# Altium integrated library Weidmueller_OMNIMATE_Signal.IntLib: 2550 symbols (part 8 of 45) (continued)
## 1250370000_Single (continued)

## 1250380000
designator E?
OMNIMATE Signal - series LSF; PartNumber: 1250380000; Manufacturer: Weidmueller; Short_text_for_material: LSF-SMD 3.50/04/180 SN BK RL; Side_termination_characteristic: closed side; Mounting_onto_the_PCB: Reflow solder connection; Pitch_mm: 3,5 mm; Pitch_inch: 0,138 inch; No_of_poles: 4; Contact_material: Cu-Leg; Contact_surface: tinned; Insulating_material: LCP GF; UL_94_flammability_rating: V-0; Rated_voltage_for_surge_voltage_class_pollution_degree_II_2: 320 V; Solid_min_H05_07_V_U: 0,2 mm²; Solid_max_H05_07_V_U: 1,5 mm²; Rated_voltage_use_group_B_UL_1059: 300 V; Rated_current_use_group_B_UL_1059: 12 A; Wire_cross_section_AWG_min_UL_1059: AWG 24; Wire_cross_section_AWG_max_UL_1059: AWG 16; PackageReference: LSF_SMD_3_5_180_04; Colour: Black; Packaging: Tape; Qty: 180 PCS; Revision: V1; ComponentLink1Description: Manufacturer URL; ComponentLink1URL: http://www.weidmueller.com/; ComponentLink2Description: URL Link1; ComponentLink2URL: http://catalog.weidmueller.com/catalog/Start.do?localeId=en&ObjectID=1250380000
footprint LSF_SMD_3_5_180_04 (OMNIMATE Signal - Serie LSF  LSF-SMD 3.50/04/180)
pins: A1, A2, A3, A4
1 alternate drawing of the same symbol

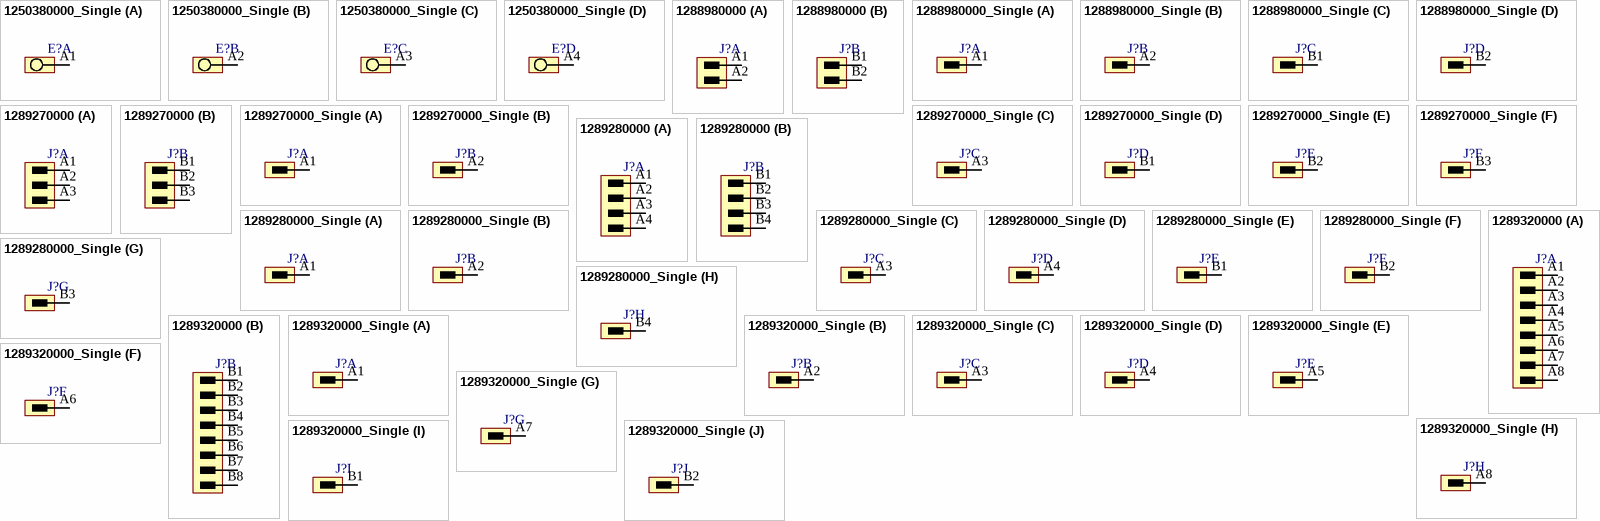
[diagram p46: symbols 1250380000_Single to 1289320000_Single]

## 1250380000_Single
designator E?
OMNIMATE Signal - series LSF; PartNumber: 1250380000; Manufacturer: Weidmueller; Short_text_for_material: LSF-SMD 3.50/04/180 SN BK RL; Side_termination_characteristic: closed side; Mounting_onto_the_PCB: Reflow solder connection; Pitch_mm: 3,5 mm; Pitch_inch: 0,138 inch; No_of_poles: 4; Contact_material: Cu-Leg; Contact_surface: tinned; Insulating_material: LCP GF; UL_94_flammability_rating: V-0; Rated_voltage_for_surge_voltage_class_pollution_degree_II_2: 320 V; Solid_min_H05_07_V_U: 0,2 mm²; Solid_max_H05_07_V_U: 1,5 mm²; Rated_voltage_use_group_B_UL_1059: 300 V; Rated_current_use_group_B_UL_1059: 12 A; Wire_cross_section_AWG_min_UL_1059: AWG 24; Wire_cross_section_AWG_max_UL_1059: AWG 16; PackageReference: LSF_SMD_3_5_180_04; Colour: Black; Packaging: Tape; Qty: 180 PCS; Revision: V1; ComponentLink1Description: Manufacturer URL; ComponentLink1URL: http://www.weidmueller.com/; ComponentLink2Description: URL Link1; ComponentLink2URL: http://catalog.weidmueller.com/catalog/Start.do?localeId=en&ObjectID=1250380000
footprint LSF_SMD_3_5_180_04 (OMNIMATE Signal - Serie LSF  LSF-SMD 3.50/04/180)
part A pins: A1
part B pins: A2
part C pins: A3
part D pins: A4
1 alternate drawing of the same symbol

## 1288980000
designator J?
OMNIMATE Signal - series B2C/S2C 3.50 - 2-row; PartNumber: 1288980000; Manufacturer: Weidmueller; Short_text_for_material: S2C-SMT 3.50/04/90G 3.2SN BK BX; Side_termination_characteristic: closed side; Mounting_onto_the_PCB: Reflow solder connection; Pitch_mm: 3.5 mm; Pitch_inch: 0.138 inch; No_of_poles: 4; Outgoing_elbow: 90°; Solder_pin_length_mm: 3.2 mm; Contact_surface: tinned; Insulating_material: LCP GF; UL_94_flammability_rating: V-0; Rated_voltage_for_surge_voltage_class_pollution_degree_II_2: 200 V; Rated_current_min_no_of_poles_TU_20_deg_C: 13.4 A; Rated_voltage_use_group_B_UL_1059: 150 V; Rated_current_use_group_B_UL_1059: 10 A; PackageReference: S2C_SMT_3_50_90G_04; Colour: Black; Packaging: Box; Qty: 222 PCS; Revision: V1; ComponentLink1Description: Manufacturer URL; ComponentLink1URL: http://www.weidmueller.com/; ComponentLink2Description: URL Link1; ComponentLink2URL: http://catalog.weidmueller.com/catalog/Start.do?localeId=en&ObjectID=1288980000
footprint S2C_SMT_3_50_90G_04 (OMNIMATE Signal - Serie B2C/S2C 3.50 - 2-reihig  S2C-SMT 3.50/04/90G 1.5S)
part A pins: A1, A2
part B pins: B1, B2

## 1288980000_Single
designator J?
OMNIMATE Signal - series B2C/S2C 3.50 - 2-row; PartNumber: 1288980000; Manufacturer: Weidmueller; Short_text_for_material: S2C-SMT 3.50/04/90G 3.2SN BK BX; Side_termination_characteristic: closed side; Mounting_onto_the_PCB: Reflow solder connection; Pitch_mm: 3.5 mm; Pitch_inch: 0.138 inch; No_of_poles: 4; Outgoing_elbow: 90°; Solder_pin_length_mm: 3.2 mm; Contact_surface: tinned; Insulating_material: LCP GF; UL_94_flammability_rating: V-0; Rated_voltage_for_surge_voltage_class_pollution_degree_II_2: 200 V; Rated_current_min_no_of_poles_TU_20_deg_C: 13.4 A; Rated_voltage_use_group_B_UL_1059: 150 V; Rated_current_use_group_B_UL_1059: 10 A; PackageReference: S2C_SMT_3_50_90G_04; Colour: Black; Packaging: Box; Qty: 222 PCS; Revision: V1; ComponentLink1Description: Manufacturer URL; ComponentLink1URL: http://www.weidmueller.com/; ComponentLink2Description: URL Link1; ComponentLink2URL: http://catalog.weidmueller.com/catalog/Start.do?localeId=en&ObjectID=1288980000
footprint S2C_SMT_3_50_90G_04 (OMNIMATE Signal - Serie B2C/S2C 3.50 - 2-reihig  S2C-SMT 3.50/04/90G 1.5S)
part A pins: A1
part B pins: A2
part C pins: B1
part D pins: B2

## 1289270000
designator J?
OMNIMATE Signal - series B2C/S2C 3.50 - 2-row; PartNumber: 1289270000; Manufacturer: Weidmueller; Short_text_for_material: S2C-SMT 3.50/06/90G 3.2SN BK BX; Side_termination_characteristic: closed side; Mounting_onto_the_PCB: Reflow solder connection; Pitch_mm: 3.5 mm; Pitch_inch: 0.138 inch; No_of_poles: 6; Outgoing_elbow: 90°; Solder_pin_length_mm: 3.2 mm; Contact_surface: tinned; Insulating_material: LCP GF; UL_94_flammability_rating: V-0; Rated_voltage_for_surge_voltage_class_pollution_degree_II_2: 200 V; Rated_current_min_no_of_poles_TU_20_deg_C: 13.4 A; Rated_voltage_use_group_B_UL_1059: 150 V; Rated_current_use_group_B_UL_1059: 10 A; PackageReference: S2C_SMT_3_50_90G_06; Colour: Black; Packaging: Box; Qty: 156 PCS; Revision: V1; ComponentLink1Description: Manufacturer URL; ComponentLink1URL: http://www.weidmueller.com/; ComponentLink2Description: URL Link1; ComponentLink2URL: http://catalog.weidmueller.com/catalog/Start.do?localeId=en&ObjectID=1289270000
footprint S2C_SMT_3_50_90G_06 (OMNIMATE Signal - Serie B2C/S2C 3.50 - 2-reihig  S2C-SMT 3.50/06/90G 1.5S)
part A pins: A1, A2, A3
part B pins: B1, B2, B3

## 1289270000_Single
designator J?
OMNIMATE Signal - series B2C/S2C 3.50 - 2-row; PartNumber: 1289270000; Manufacturer: Weidmueller; Short_text_for_material: S2C-SMT 3.50/06/90G 3.2SN BK BX; Side_termination_characteristic: closed side; Mounting_onto_the_PCB: Reflow solder connection; Pitch_mm: 3.5 mm; Pitch_inch: 0.138 inch; No_of_poles: 6; Outgoing_elbow: 90°; Solder_pin_length_mm: 3.2 mm; Contact_surface: tinned; Insulating_material: LCP GF; UL_94_flammability_rating: V-0; Rated_voltage_for_surge_voltage_class_pollution_degree_II_2: 200 V; Rated_current_min_no_of_poles_TU_20_deg_C: 13.4 A; Rated_voltage_use_group_B_UL_1059: 150 V; Rated_current_use_group_B_UL_1059: 10 A; PackageReference: S2C_SMT_3_50_90G_06; Colour: Black; Packaging: Box; Qty: 156 PCS; Revision: V1; ComponentLink1Description: Manufacturer URL; ComponentLink1URL: http://www.weidmueller.com/; ComponentLink2Description: URL Link1; ComponentLink2URL: http://catalog.weidmueller.com/catalog/Start.do?localeId=en&ObjectID=1289270000
footprint S2C_SMT_3_50_90G_06 (OMNIMATE Signal - Serie B2C/S2C 3.50 - 2-reihig  S2C-SMT 3.50/06/90G 1.5S)
part A pins: A1
part B pins: A2
part C pins: A3
part D pins: B1
part E pins: B2
part F pins: B3

## 1289280000
designator J?
OMNIMATE Signal - series B2C/S2C 3.50 - 2-row; PartNumber: 1289280000; Manufacturer: Weidmueller; Short_text_for_material: S2C-SMT 3.50/08/90G 3.2SN BK BX; Side_termination_characteristic: closed side; Mounting_onto_the_PCB: Reflow solder connection; Pitch_mm: 3.5 mm; Pitch_inch: 0.138 inch; No_of_poles: 8; Outgoing_elbow: 90°; Solder_pin_length_mm: 3.2 mm; Contact_surface: tinned; Insulating_material: LCP GF; UL_94_flammability_rating: V-0; Rated_voltage_for_surge_voltage_class_pollution_degree_II_2: 200 V; Rated_current_min_no_of_poles_TU_20_deg_C: 13.4 A; Rated_voltage_use_group_B_UL_1059: 150 V; Rated_current_use_group_B_UL_1059: 10 A; PackageReference: S2C_SMT_3_50_90G_08; Colour: Black; Packaging: Box; Qty: 120 PCS; Revision: V1; ComponentLink1Description: Manufacturer URL; ComponentLink1URL: http://www.weidmueller.com/; ComponentLink2Description: URL Link1; ComponentLink2URL: http://catalog.weidmueller.com/catalog/Start.do?localeId=en&ObjectID=1289280000
footprint S2C_SMT_3_50_90G_08 (OMNIMATE Signal - Serie B2C/S2C 3.50 - 2-reihig  S2C-SMT 3.50/08/90G 1.5S)
part A pins: A1, A2, A3, A4
part B pins: B1, B2, B3, B4

## 1289280000_Single
designator J?
OMNIMATE Signal - series B2C/S2C 3.50 - 2-row; PartNumber: 1289280000; Manufacturer: Weidmueller; Short_text_for_material: S2C-SMT 3.50/08/90G 3.2SN BK BX; Side_termination_characteristic: closed side; Mounting_onto_the_PCB: Reflow solder connection; Pitch_mm: 3.5 mm; Pitch_inch: 0.138 inch; No_of_poles: 8; Outgoing_elbow: 90°; Solder_pin_length_mm: 3.2 mm; Contact_surface: tinned; Insulating_material: LCP GF; UL_94_flammability_rating: V-0; Rated_voltage_for_surge_voltage_class_pollution_degree_II_2: 200 V; Rated_current_min_no_of_poles_TU_20_deg_C: 13.4 A; Rated_voltage_use_group_B_UL_1059: 150 V; Rated_current_use_group_B_UL_1059: 10 A; PackageReference: S2C_SMT_3_50_90G_08; Colour: Black; Packaging: Box; Qty: 120 PCS; Revision: V1; ComponentLink1Description: Manufacturer URL; ComponentLink1URL: http://www.weidmueller.com/; ComponentLink2Description: URL Link1; ComponentLink2URL: http://catalog.weidmueller.com/catalog/Start.do?localeId=en&ObjectID=1289280000
footprint S2C_SMT_3_50_90G_08 (OMNIMATE Signal - Serie B2C/S2C 3.50 - 2-reihig  S2C-SMT 3.50/08/90G 1.5S)
part A pins: A1
part B pins: A2
part C pins: A3
part D pins: A4
part E pins: B1
part F pins: B2
part G pins: B3
part H pins: B4

## 1289320000
designator J?
OMNIMATE Signal - series B2C/S2C 3.50 - 2-row; PartNumber: 1289320000; Manufacturer: Weidmueller; Short_text_for_material: S2C-SMT 3.50/16/90G 3.2SN BK BX; Side_termination_characteristic: closed side; Mounting_onto_the_PCB: Reflow solder connection; Pitch_mm: 3.5 mm; Pitch_inch: 0.138 inch; No_of_poles: 16; Outgoing_elbow: 90°; Solder_pin_length_mm: 3.2 mm; Contact_surface: tinned; Insulating_material: LCP GF; UL_94_flammability_rating: V-0; Rated_voltage_for_surge_voltage_class_pollution_degree_II_2: 200 V; Rated_current_min_no_of_poles_TU_20_deg_C: 13.4 A; Rated_voltage_use_group_B_UL_1059: 150 V; Rated_current_use_group_B_UL_1059: 10 A; PackageReference: S2C_SMT_3_50_90G_16; Colour: Black; Packaging: Box; Qty: 60 PCS; Revision: V1; ComponentLink1Description: Manufacturer URL; ComponentLink1URL: http://www.weidmueller.com/; ComponentLink2Description: URL Link1; ComponentLink2URL: http://catalog.weidmueller.com/catalog/Start.do?localeId=en&ObjectID=1289320000
footprint S2C_SMT_3_50_90G_16 (OMNIMATE Signal - Serie B2C/S2C 3.50 - 2-reihig  S2C-SMT 3.50/16/90G 1.5S)
part A pins: A1, A2, A3, A4, A5, A6, A7, A8
part B pins: B1, B2, B3, B4, B5, B6, B7, B8

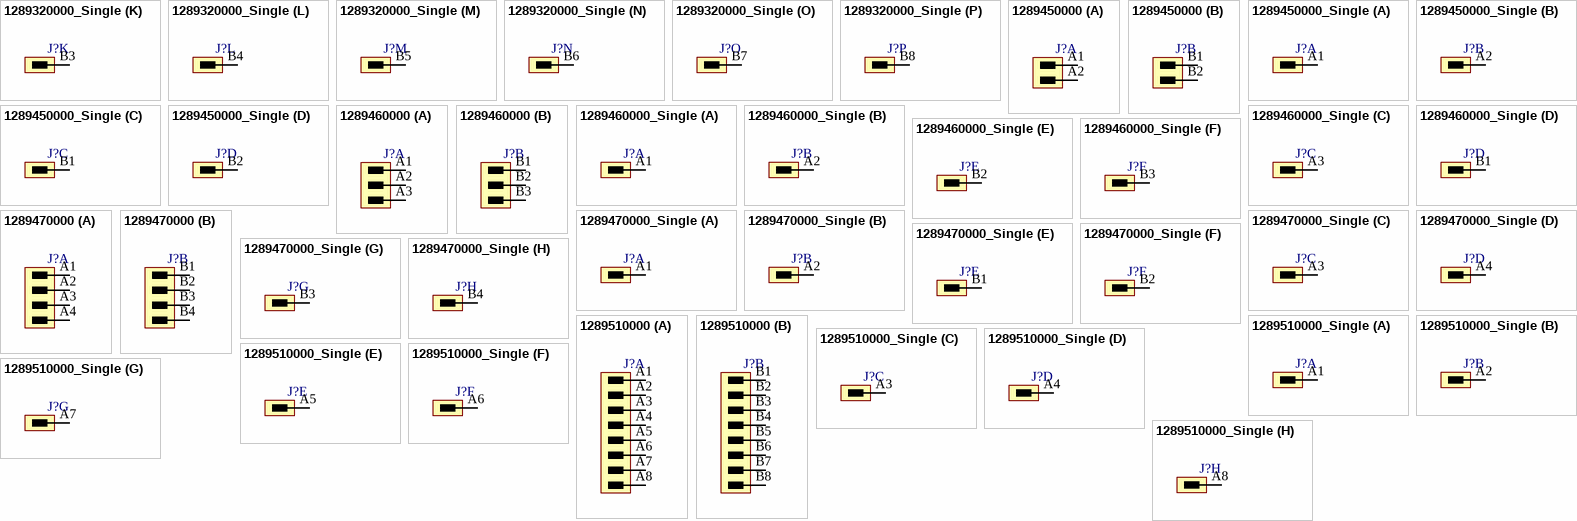
[diagram p47: symbols 1289320000_Single to 1289510000_Single]

## 1289320000_Single
designator J?
OMNIMATE Signal - series B2C/S2C 3.50 - 2-row; PartNumber: 1289320000; Manufacturer: Weidmueller; Short_text_for_material: S2C-SMT 3.50/16/90G 3.2SN BK BX; Side_termination_characteristic: closed side; Mounting_onto_the_PCB: Reflow solder connection; Pitch_mm: 3.5 mm; Pitch_inch: 0.138 inch; No_of_poles: 16; Outgoing_elbow: 90°; Solder_pin_length_mm: 3.2 mm; Contact_surface: tinned; Insulating_material: LCP GF; UL_94_flammability_rating: V-0; Rated_voltage_for_surge_voltage_class_pollution_degree_II_2: 200 V; Rated_current_min_no_of_poles_TU_20_deg_C: 13.4 A; Rated_voltage_use_group_B_UL_1059: 150 V; Rated_current_use_group_B_UL_1059: 10 A; PackageReference: S2C_SMT_3_50_90G_16; Colour: Black; Packaging: Box; Qty: 60 PCS; Revision: V1; ComponentLink1Description: Manufacturer URL; ComponentLink1URL: http://www.weidmueller.com/; ComponentLink2Description: URL Link1; ComponentLink2URL: http://catalog.weidmueller.com/catalog/Start.do?localeId=en&ObjectID=1289320000
footprint S2C_SMT_3_50_90G_16 (OMNIMATE Signal - Serie B2C/S2C 3.50 - 2-reihig  S2C-SMT 3.50/16/90G 1.5S)
part A pins: A1
part B pins: A2
part C pins: A3
part D pins: A4
part E pins: A5
part F pins: A6
part G pins: A7
part H pins: A8
part I pins: B1
part J pins: B2
part K pins: B3
part L pins: B4
part M pins: B5
part N pins: B6
part O pins: B7
part P pins: B8

## 1289450000
designator J?
OMNIMATE Signal - series B2C/S2C 3.50 - 2-row; PartNumber: 1289450000; Manufacturer: Weidmueller; Short_text_for_material: S2C-SMT 3.50/04/90LF 3.2SN BK BX; Side_termination_characteristic: Solder flange; Mounting_onto_the_PCB: Reflow solder connection; Pitch_mm: 3.5 mm; Pitch_inch: 0.138 inch; No_of_poles: 4; Outgoing_elbow: 90°; Solder_pin_length_mm: 3.2 mm; Contact_surface: tinned; Insulating_material: LCP GF; UL_94_flammability_rating: V-0; Rated_voltage_for_surge_voltage_class_pollution_degree_II_2: 200 V; Rated_current_min_no_of_poles_TU_20_deg_C: 13.4 A; Rated_voltage_use_group_B_UL_1059: 150 V; Rated_current_use_group_B_UL_1059: 10 A; PackageReference: S2C_SMT_3_50_90LF_04; Colour: Black; Packaging: Box; Qty: 132 PCS; Revision: V1; ComponentLink1Description: Manufacturer URL; ComponentLink1URL: http://www.weidmueller.com/; ComponentLink2Description: URL Link1; ComponentLink2URL: http://catalog.weidmueller.com/catalog/Start.do?localeId=en&ObjectID=1289450000
footprint S2C_SMT_3_50_90LF_04 (OMNIMATE Signal - Serie B2C/S2C 3.50 - 2-reihig  S2C-SMT 3.50/04/90LF 1.5)
part A pins: A1, A2
part B pins: B1, B2

## 1289450000_Single
designator J?
OMNIMATE Signal - series B2C/S2C 3.50 - 2-row; PartNumber: 1289450000; Manufacturer: Weidmueller; Short_text_for_material: S2C-SMT 3.50/04/90LF 3.2SN BK BX; Side_termination_characteristic: Solder flange; Mounting_onto_the_PCB: Reflow solder connection; Pitch_mm: 3.5 mm; Pitch_inch: 0.138 inch; No_of_poles: 4; Outgoing_elbow: 90°; Solder_pin_length_mm: 3.2 mm; Contact_surface: tinned; Insulating_material: LCP GF; UL_94_flammability_rating: V-0; Rated_voltage_for_surge_voltage_class_pollution_degree_II_2: 200 V; Rated_current_min_no_of_poles_TU_20_deg_C: 13.4 A; Rated_voltage_use_group_B_UL_1059: 150 V; Rated_current_use_group_B_UL_1059: 10 A; PackageReference: S2C_SMT_3_50_90LF_04; Colour: Black; Packaging: Box; Qty: 132 PCS; Revision: V1; ComponentLink1Description: Manufacturer URL; ComponentLink1URL: http://www.weidmueller.com/; ComponentLink2Description: URL Link1; ComponentLink2URL: http://catalog.weidmueller.com/catalog/Start.do?localeId=en&ObjectID=1289450000
footprint S2C_SMT_3_50_90LF_04 (OMNIMATE Signal - Serie B2C/S2C 3.50 - 2-reihig  S2C-SMT 3.50/04/90LF 1.5)
part A pins: A1
part B pins: A2
part C pins: B1
part D pins: B2

## 1289460000
designator J?
OMNIMATE Signal - series B2C/S2C 3.50 - 2-row; PartNumber: 1289460000; Manufacturer: Weidmueller; Short_text_for_material: S2C-SMT 3.50/06/90LF 3.2SN BK BX; Side_termination_characteristic: Solder flange; Mounting_onto_the_PCB: Reflow solder connection; Pitch_mm: 3.5 mm; Pitch_inch: 0.138 inch; No_of_poles: 6; Outgoing_elbow: 90°; Solder_pin_length_mm: 3.2 mm; Contact_surface: tinned; Insulating_material: LCP GF; UL_94_flammability_rating: V-0; Rated_voltage_for_surge_voltage_class_pollution_degree_II_2: 200 V; Rated_current_min_no_of_poles_TU_20_deg_C: 13.4 A; Rated_voltage_use_group_B_UL_1059: 150 V; Rated_current_use_group_B_UL_1059: 10 A; PackageReference: S2C_SMT_3_50_90LF_06; Colour: Black; Packaging: Box; Qty: 102 PCS; Revision: V1; ComponentLink1Description: Manufacturer URL; ComponentLink1URL: http://www.weidmueller.com/; ComponentLink2Description: URL Link1; ComponentLink2URL: http://catalog.weidmueller.com/catalog/Start.do?localeId=en&ObjectID=1289460000
footprint S2C_SMT_3_50_90LF_06 (OMNIMATE Signal - Serie B2C/S2C 3.50 - 2-reihig  S2C-SMT 3.50/06/90LF 1.5)
part A pins: A1, A2, A3
part B pins: B1, B2, B3

## 1289460000_Single
designator J?
OMNIMATE Signal - series B2C/S2C 3.50 - 2-row; PartNumber: 1289460000; Manufacturer: Weidmueller; Short_text_for_material: S2C-SMT 3.50/06/90LF 3.2SN BK BX; Side_termination_characteristic: Solder flange; Mounting_onto_the_PCB: Reflow solder connection; Pitch_mm: 3.5 mm; Pitch_inch: 0.138 inch; No_of_poles: 6; Outgoing_elbow: 90°; Solder_pin_length_mm: 3.2 mm; Contact_surface: tinned; Insulating_material: LCP GF; UL_94_flammability_rating: V-0; Rated_voltage_for_surge_voltage_class_pollution_degree_II_2: 200 V; Rated_current_min_no_of_poles_TU_20_deg_C: 13.4 A; Rated_voltage_use_group_B_UL_1059: 150 V; Rated_current_use_group_B_UL_1059: 10 A; PackageReference: S2C_SMT_3_50_90LF_06; Colour: Black; Packaging: Box; Qty: 102 PCS; Revision: V1; ComponentLink1Description: Manufacturer URL; ComponentLink1URL: http://www.weidmueller.com/; ComponentLink2Description: URL Link1; ComponentLink2URL: http://catalog.weidmueller.com/catalog/Start.do?localeId=en&ObjectID=1289460000
footprint S2C_SMT_3_50_90LF_06 (OMNIMATE Signal - Serie B2C/S2C 3.50 - 2-reihig  S2C-SMT 3.50/06/90LF 1.5)
part A pins: A1
part B pins: A2
part C pins: A3
part D pins: B1
part E pins: B2
part F pins: B3

## 1289470000
designator J?
OMNIMATE Signal - series B2C/S2C 3.50 - 2-row; PartNumber: 1289470000; Manufacturer: Weidmueller; Short_text_for_material: S2C-SMT 3.50/08/90LF 3.2SN BK BX; Side_termination_characteristic: Solder flange; Mounting_onto_the_PCB: Reflow solder connection; Pitch_mm: 3.5 mm; Pitch_inch: 0.138 inch; No_of_poles: 8; Outgoing_elbow: 90°; Solder_pin_length_mm: 3.2 mm; Contact_surface: tinned; Insulating_material: LCP GF; UL_94_flammability_rating: V-0; Rated_voltage_for_surge_voltage_class_pollution_degree_II_2: 200 V; Rated_current_min_no_of_poles_TU_20_deg_C: 13.4 A; Rated_voltage_use_group_B_UL_1059: 150 V; Rated_current_use_group_B_UL_1059: 10 A; PackageReference: S2C_SMT_3_50_90LF_08; Colour: Black; Packaging: Box; Qty: 84 PCS; Revision: V1; ComponentLink1Description: Manufacturer URL; ComponentLink1URL: http://www.weidmueller.com/; ComponentLink2Description: URL Link1; ComponentLink2URL: http://catalog.weidmueller.com/catalog/Start.do?localeId=en&ObjectID=1289470000
footprint S2C_SMT_3_50_90LF_08 (OMNIMATE Signal - Serie B2C/S2C 3.50 - 2-reihig  S2C-SMT 3.50/08/90LF 1.5)
part A pins: A1, A2, A3, A4
part B pins: B1, B2, B3, B4

## 1289470000_Single
designator J?
OMNIMATE Signal - series B2C/S2C 3.50 - 2-row; PartNumber: 1289470000; Manufacturer: Weidmueller; Short_text_for_material: S2C-SMT 3.50/08/90LF 3.2SN BK BX; Side_termination_characteristic: Solder flange; Mounting_onto_the_PCB: Reflow solder connection; Pitch_mm: 3.5 mm; Pitch_inch: 0.138 inch; No_of_poles: 8; Outgoing_elbow: 90°; Solder_pin_length_mm: 3.2 mm; Contact_surface: tinned; Insulating_material: LCP GF; UL_94_flammability_rating: V-0; Rated_voltage_for_surge_voltage_class_pollution_degree_II_2: 200 V; Rated_current_min_no_of_poles_TU_20_deg_C: 13.4 A; Rated_voltage_use_group_B_UL_1059: 150 V; Rated_current_use_group_B_UL_1059: 10 A; PackageReference: S2C_SMT_3_50_90LF_08; Colour: Black; Packaging: Box; Qty: 84 PCS; Revision: V1; ComponentLink1Description: Manufacturer URL; ComponentLink1URL: http://www.weidmueller.com/; ComponentLink2Description: URL Link1; ComponentLink2URL: http://catalog.weidmueller.com/catalog/Start.do?localeId=en&ObjectID=1289470000
footprint S2C_SMT_3_50_90LF_08 (OMNIMATE Signal - Serie B2C/S2C 3.50 - 2-reihig  S2C-SMT 3.50/08/90LF 1.5)
part A pins: A1
part B pins: A2
part C pins: A3
part D pins: A4
part E pins: B1
part F pins: B2
part G pins: B3
part H pins: B4

## 1289510000
designator J?
OMNIMATE Signal - series B2C/S2C 3.50 - 2-row; PartNumber: 1289510000; Manufacturer: Weidmueller; Short_text_for_material: S2C-SMT 3.50/16/90LF 3.2SN BK BX; Side_termination_characteristic: Solder flange; Mounting_onto_the_PCB: Reflow solder connection; Pitch_mm: 3.5 mm; Pitch_inch: 0.138 inch; No_of_poles: 16; Outgoing_elbow: 90°; Solder_pin_length_mm: 3.2 mm; Contact_surface: tinned; Insulating_material: LCP GF; UL_94_flammability_rating: V-0; Rated_voltage_for_surge_voltage_class_pollution_degree_II_2: 200 V; Rated_current_min_no_of_poles_TU_20_deg_C: 13.4 A; Rated_voltage_use_group_B_UL_1059: 150 V; Rated_current_use_group_B_UL_1059: 10 A; PackageReference: S2C_SMT_3_50_90LF_16; Colour: Black; Packaging: Box; Qty: 48 PCS; Revision: V1; ComponentLink1Description: Manufacturer URL; ComponentLink1URL: http://www.weidmueller.com/; ComponentLink2Description: URL Link1; ComponentLink2URL: http://catalog.weidmueller.com/catalog/Start.do?localeId=en&ObjectID=1289510000
footprint S2C_SMT_3_50_90LF_16 (OMNIMATE Signal - Serie B2C/S2C 3.50 - 2-reihig  S2C-SMT 3.50/16/90LF 1.5)
part A pins: A1, A2, A3, A4, A5, A6, A7, A8
part B pins: B1, B2, B3, B4, B5, B6, B7, B8

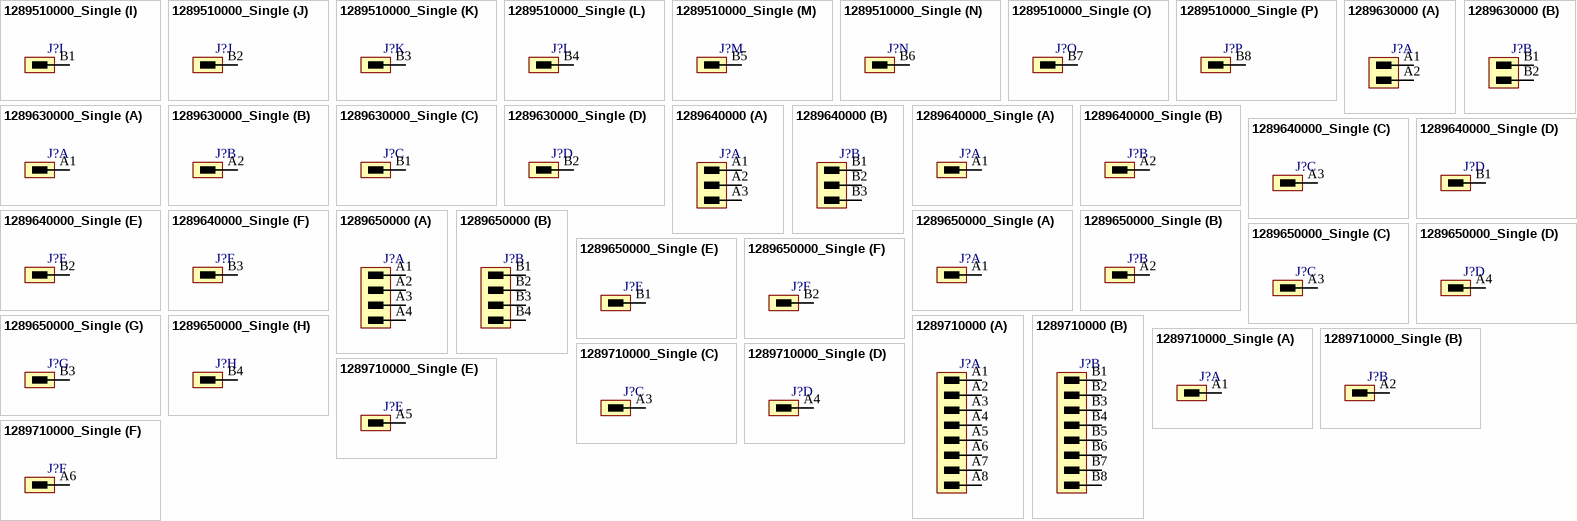
[diagram p48: symbols 1289510000_Single to 1289710000_Single]

## 1289510000_Single
designator J?
OMNIMATE Signal - series B2C/S2C 3.50 - 2-row; PartNumber: 1289510000; Manufacturer: Weidmueller; Short_text_for_material: S2C-SMT 3.50/16/90LF 3.2SN BK BX; Side_termination_characteristic: Solder flange; Mounting_onto_the_PCB: Reflow solder connection; Pitch_mm: 3.5 mm; Pitch_inch: 0.138 inch; No_of_poles: 16; Outgoing_elbow: 90°; Solder_pin_length_mm: 3.2 mm; Contact_surface: tinned; Insulating_material: LCP GF; UL_94_flammability_rating: V-0; Rated_voltage_for_surge_voltage_class_pollution_degree_II_2: 200 V; Rated_current_min_no_of_poles_TU_20_deg_C: 13.4 A; Rated_voltage_use_group_B_UL_1059: 150 V; Rated_current_use_group_B_UL_1059: 10 A; PackageReference: S2C_SMT_3_50_90LF_16; Colour: Black; Packaging: Box; Qty: 48 PCS; Revision: V1; ComponentLink1Description: Manufacturer URL; ComponentLink1URL: http://www.weidmueller.com/; ComponentLink2Description: URL Link1; ComponentLink2URL: http://catalog.weidmueller.com/catalog/Start.do?localeId=en&ObjectID=1289510000
footprint S2C_SMT_3_50_90LF_16 (OMNIMATE Signal - Serie B2C/S2C 3.50 - 2-reihig  S2C-SMT 3.50/16/90LF 1.5)
part A pins: A1
part B pins: A2
part C pins: A3
part D pins: A4
part E pins: A5
part F pins: A6
part G pins: A7
part H pins: A8
part I pins: B1
part J pins: B2
part K pins: B3
part L pins: B4
part M pins: B5
part N pins: B6
part O pins: B7
part P pins: B8

## 1289630000
designator J?
OMNIMATE Signal - series B2C/S2C 3.50 - 2-row; PartNumber: 1289630000; Manufacturer: Weidmueller; Short_text_for_material: S2C-SMT 3.50/04/90G 1.5SN BK BX; Side_termination_characteristic: closed side; Mounting_onto_the_PCB: Reflow solder connection; Pitch_mm: 3.5 mm; Pitch_inch: 0.138 inch; No_of_poles: 4; Outgoing_elbow: 90°; Solder_pin_length_mm: 1.5 mm; Contact_material: Cu-Leg; Contact_surface: tinned; Insulating_material: LCP GF; UL_94_flammability_rating: V-0; Rated_voltage_for_surge_voltage_class_pollution_degree_II_2: 200 V; Rated_voltage_use_group_B_UL_1059: 150 V; Rated_current_use_group_B_UL_1059: 10 A; PackageReference: S2C_SMT_3_50_90G_04; Colour: Black; Packaging: Box; Qty: 222 PCS; Revision: V1; ComponentLink1Description: Manufacturer URL; ComponentLink1URL: http://www.weidmueller.com/; ComponentLink2Description: URL Link1; ComponentLink2URL: http://catalog.weidmueller.com/catalog/Start.do?localeId=en&ObjectID=1289630000
footprint S2C_SMT_3_50_90G_04 (OMNIMATE Signal - Serie B2C/S2C 3.50 - 2-reihig  S2C-SMT 3.50/04/90G 1.5S)
part A pins: A1, A2
part B pins: B1, B2

## 1289630000_Single
designator J?
OMNIMATE Signal - series B2C/S2C 3.50 - 2-row; PartNumber: 1289630000; Manufacturer: Weidmueller; Short_text_for_material: S2C-SMT 3.50/04/90G 1.5SN BK BX; Side_termination_characteristic: closed side; Mounting_onto_the_PCB: Reflow solder connection; Pitch_mm: 3.5 mm; Pitch_inch: 0.138 inch; No_of_poles: 4; Outgoing_elbow: 90°; Solder_pin_length_mm: 1.5 mm; Contact_material: Cu-Leg; Contact_surface: tinned; Insulating_material: LCP GF; UL_94_flammability_rating: V-0; Rated_voltage_for_surge_voltage_class_pollution_degree_II_2: 200 V; Rated_voltage_use_group_B_UL_1059: 150 V; Rated_current_use_group_B_UL_1059: 10 A; PackageReference: S2C_SMT_3_50_90G_04; Colour: Black; Packaging: Box; Qty: 222 PCS; Revision: V1; ComponentLink1Description: Manufacturer URL; ComponentLink1URL: http://www.weidmueller.com/; ComponentLink2Description: URL Link1; ComponentLink2URL: http://catalog.weidmueller.com/catalog/Start.do?localeId=en&ObjectID=1289630000
footprint S2C_SMT_3_50_90G_04 (OMNIMATE Signal - Serie B2C/S2C 3.50 - 2-reihig  S2C-SMT 3.50/04/90G 1.5S)
part A pins: A1
part B pins: A2
part C pins: B1
part D pins: B2

## 1289640000
designator J?
OMNIMATE Signal - series B2C/S2C 3.50 - 2-row; PartNumber: 1289640000; Manufacturer: Weidmueller; Short_text_for_material: S2C-SMT 3.50/06/90G 1.5SN BK BX; Side_termination_characteristic: closed side; Mounting_onto_the_PCB: Reflow solder connection; Pitch_mm: 3.5 mm; Pitch_inch: 0.138 inch; No_of_poles: 6; Outgoing_elbow: 90°; Solder_pin_length_mm: 1.5 mm; Contact_material: Cu-Leg; Contact_surface: tinned; Insulating_material: LCP GF; UL_94_flammability_rating: V-0; Rated_voltage_for_surge_voltage_class_pollution_degree_II_2: 200 V; Rated_voltage_use_group_B_UL_1059: 150 V; Rated_current_use_group_B_UL_1059: 10 A; PackageReference: S2C_SMT_3_50_90G_06; Colour: Black; Packaging: Box; Qty: 156 PCS; Revision: V1; ComponentLink1Description: Manufacturer URL; ComponentLink1URL: http://www.weidmueller.com/; ComponentLink2Description: URL Link1; ComponentLink2URL: http://catalog.weidmueller.com/catalog/Start.do?localeId=en&ObjectID=1289640000
footprint S2C_SMT_3_50_90G_06 (OMNIMATE Signal - Serie B2C/S2C 3.50 - 2-reihig  S2C-SMT 3.50/06/90G 1.5S)
part A pins: A1, A2, A3
part B pins: B1, B2, B3

## 1289640000_Single
designator J?
OMNIMATE Signal - series B2C/S2C 3.50 - 2-row; PartNumber: 1289640000; Manufacturer: Weidmueller; Short_text_for_material: S2C-SMT 3.50/06/90G 1.5SN BK BX; Side_termination_characteristic: closed side; Mounting_onto_the_PCB: Reflow solder connection; Pitch_mm: 3.5 mm; Pitch_inch: 0.138 inch; No_of_poles: 6; Outgoing_elbow: 90°; Solder_pin_length_mm: 1.5 mm; Contact_material: Cu-Leg; Contact_surface: tinned; Insulating_material: LCP GF; UL_94_flammability_rating: V-0; Rated_voltage_for_surge_voltage_class_pollution_degree_II_2: 200 V; Rated_voltage_use_group_B_UL_1059: 150 V; Rated_current_use_group_B_UL_1059: 10 A; PackageReference: S2C_SMT_3_50_90G_06; Colour: Black; Packaging: Box; Qty: 156 PCS; Revision: V1; ComponentLink1Description: Manufacturer URL; ComponentLink1URL: http://www.weidmueller.com/; ComponentLink2Description: URL Link1; ComponentLink2URL: http://catalog.weidmueller.com/catalog/Start.do?localeId=en&ObjectID=1289640000
footprint S2C_SMT_3_50_90G_06 (OMNIMATE Signal - Serie B2C/S2C 3.50 - 2-reihig  S2C-SMT 3.50/06/90G 1.5S)
part A pins: A1
part B pins: A2
part C pins: A3
part D pins: B1
part E pins: B2
part F pins: B3

## 1289650000
designator J?
OMNIMATE Signal - series B2C/S2C 3.50 - 2-row; PartNumber: 1289650000; Manufacturer: Weidmueller; Short_text_for_material: S2C-SMT 3.50/08/90G 1.5SN BK BX; Side_termination_characteristic: closed side; Mounting_onto_the_PCB: Reflow solder connection; Pitch_mm: 3.5 mm; Pitch_inch: 0.138 inch; No_of_poles: 8; Outgoing_elbow: 90°; Solder_pin_length_mm: 1.5 mm; Contact_material: Cu-Leg; Contact_surface: tinned; Insulating_material: LCP GF; UL_94_flammability_rating: V-0; Rated_voltage_for_surge_voltage_class_pollution_degree_II_2: 200 V; Rated_voltage_use_group_B_UL_1059: 150 V; Rated_current_use_group_B_UL_1059: 10 A; PackageReference: S2C_SMT_3_50_90G_08; Colour: Black; Packaging: Box; Qty: 120 PCS; Revision: V1; ComponentLink1Description: Manufacturer URL; ComponentLink1URL: http://www.weidmueller.com/; ComponentLink2Description: URL Link1; ComponentLink2URL: http://catalog.weidmueller.com/catalog/Start.do?localeId=en&ObjectID=1289650000
footprint S2C_SMT_3_50_90G_08 (OMNIMATE Signal - Serie B2C/S2C 3.50 - 2-reihig  S2C-SMT 3.50/08/90G 1.5S)
part A pins: A1, A2, A3, A4
part B pins: B1, B2, B3, B4

## 1289650000_Single
designator J?
OMNIMATE Signal - series B2C/S2C 3.50 - 2-row; PartNumber: 1289650000; Manufacturer: Weidmueller; Short_text_for_material: S2C-SMT 3.50/08/90G 1.5SN BK BX; Side_termination_characteristic: closed side; Mounting_onto_the_PCB: Reflow solder connection; Pitch_mm: 3.5 mm; Pitch_inch: 0.138 inch; No_of_poles: 8; Outgoing_elbow: 90°; Solder_pin_length_mm: 1.5 mm; Contact_material: Cu-Leg; Contact_surface: tinned; Insulating_material: LCP GF; UL_94_flammability_rating: V-0; Rated_voltage_for_surge_voltage_class_pollution_degree_II_2: 200 V; Rated_voltage_use_group_B_UL_1059: 150 V; Rated_current_use_group_B_UL_1059: 10 A; PackageReference: S2C_SMT_3_50_90G_08; Colour: Black; Packaging: Box; Qty: 120 PCS; Revision: V1; ComponentLink1Description: Manufacturer URL; ComponentLink1URL: http://www.weidmueller.com/; ComponentLink2Description: URL Link1; ComponentLink2URL: http://catalog.weidmueller.com/catalog/Start.do?localeId=en&ObjectID=1289650000
footprint S2C_SMT_3_50_90G_08 (OMNIMATE Signal - Serie B2C/S2C 3.50 - 2-reihig  S2C-SMT 3.50/08/90G 1.5S)
part A pins: A1
part B pins: A2
part C pins: A3
part D pins: A4
part E pins: B1
part F pins: B2
part G pins: B3
part H pins: B4

## 1289710000
designator J?
OMNIMATE Signal - series B2C/S2C 3.50 - 2-row; PartNumber: 1289710000; Manufacturer: Weidmueller; Short_text_for_material: S2C-SMT 3.50/16/90G 1.5SN BK BX; Side_termination_characteristic: closed side; Mounting_onto_the_PCB: Reflow solder connection; Pitch_mm: 3.5 mm; Pitch_inch: 0.138 inch; No_of_poles: 16; Outgoing_elbow: 90°; Solder_pin_length_mm: 1.5 mm; Contact_material: Cu-Leg; Contact_surface: tinned; Insulating_material: LCP GF; UL_94_flammability_rating: V-0; Rated_voltage_for_surge_voltage_class_pollution_degree_II_2: 200 V; Rated_voltage_use_group_B_UL_1059: 150 V; Rated_current_use_group_B_UL_1059: 10 A; PackageReference: S2C_SMT_3_50_90G_16; Colour: Black; Packaging: Box; Qty: 60 PCS; Revision: V1; ComponentLink1Description: Manufacturer URL; ComponentLink1URL: http://www.weidmueller.com/; ComponentLink2Description: URL Link1; ComponentLink2URL: http://catalog.weidmueller.com/catalog/Start.do?localeId=en&ObjectID=1289710000
footprint S2C_SMT_3_50_90G_16 (OMNIMATE Signal - Serie B2C/S2C 3.50 - 2-reihig  S2C-SMT 3.50/16/90G 1.5S)
part A pins: A1, A2, A3, A4, A5, A6, A7, A8
part B pins: B1, B2, B3, B4, B5, B6, B7, B8

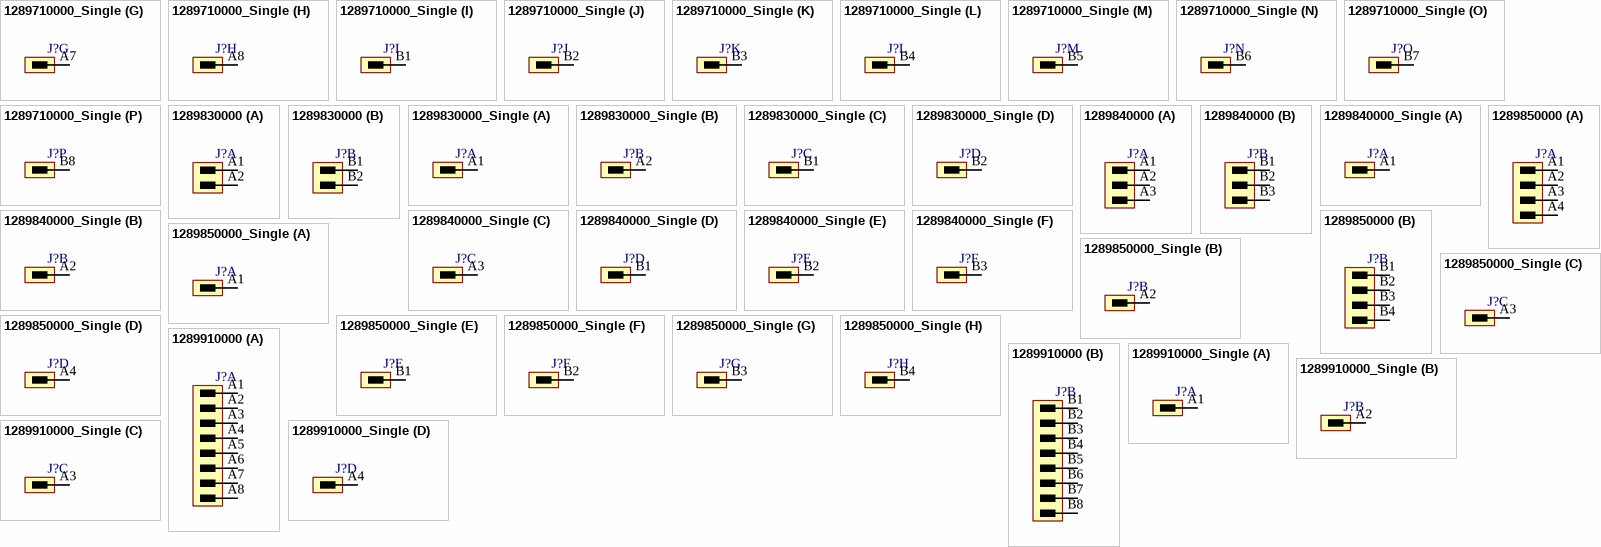
[diagram p49: symbols 1289710000_Single to 1289910000_Single]

## 1289710000_Single
designator J?
OMNIMATE Signal - series B2C/S2C 3.50 - 2-row; PartNumber: 1289710000; Manufacturer: Weidmueller; Short_text_for_material: S2C-SMT 3.50/16/90G 1.5SN BK BX; Side_termination_characteristic: closed side; Mounting_onto_the_PCB: Reflow solder connection; Pitch_mm: 3.5 mm; Pitch_inch: 0.138 inch; No_of_poles: 16; Outgoing_elbow: 90°; Solder_pin_length_mm: 1.5 mm; Contact_material: Cu-Leg; Contact_surface: tinned; Insulating_material: LCP GF; UL_94_flammability_rating: V-0; Rated_voltage_for_surge_voltage_class_pollution_degree_II_2: 200 V; Rated_voltage_use_group_B_UL_1059: 150 V; Rated_current_use_group_B_UL_1059: 10 A; PackageReference: S2C_SMT_3_50_90G_16; Colour: Black; Packaging: Box; Qty: 60 PCS; Revision: V1; ComponentLink1Description: Manufacturer URL; ComponentLink1URL: http://www.weidmueller.com/; ComponentLink2Description: URL Link1; ComponentLink2URL: http://catalog.weidmueller.com/catalog/Start.do?localeId=en&ObjectID=1289710000
footprint S2C_SMT_3_50_90G_16 (OMNIMATE Signal - Serie B2C/S2C 3.50 - 2-reihig  S2C-SMT 3.50/16/90G 1.5S)
part A pins: A1
part B pins: A2
part C pins: A3
part D pins: A4
part E pins: A5
part F pins: A6
part G pins: A7
part H pins: A8
part I pins: B1
part J pins: B2
part K pins: B3
part L pins: B4
part M pins: B5
part N pins: B6
part O pins: B7
part P pins: B8

## 1289830000
designator J?
OMNIMATE Signal - series B2C/S2C 3.50 - 2-row; PartNumber: 1289830000; Manufacturer: Weidmueller; Short_text_for_material: S2C-SMT 3.50/04/90LF 1.5SN BK BX; Side_termination_characteristic: Solder flange; Mounting_onto_the_PCB: Reflow solder connection; Pitch_mm: 3.5 mm; Pitch_inch: 0.138 inch; No_of_poles: 4; Outgoing_elbow: 90°; Solder_pin_length_mm: 1.5 mm; Contact_material: Cu-Leg; Contact_surface: tinned; Insulating_material: LCP GF; UL_94_flammability_rating: V-0; Rated_voltage_for_surge_voltage_class_pollution_degree_II_2: 200 V; Rated_voltage_use_group_B_UL_1059: 150 V; Rated_current_use_group_B_UL_1059: 10 A; PackageReference: S2C_SMT_3_50_90LF_04; Colour: Black; Packaging: Box; Qty: 132 PCS; Revision: V1; ComponentLink1Description: Manufacturer URL; ComponentLink1URL: http://www.weidmueller.com/; ComponentLink2Description: URL Link1; ComponentLink2URL: http://catalog.weidmueller.com/catalog/Start.do?localeId=en&ObjectID=1289830000
footprint S2C_SMT_3_50_90LF_04 (OMNIMATE Signal - Serie B2C/S2C 3.50 - 2-reihig  S2C-SMT 3.50/04/90LF 1.5)
part A pins: A1, A2
part B pins: B1, B2